# Altium footprint library Test_Stand_Pergam.PcbLib: 30 footprints (part 1 of 2)
Each footprint in its own frame and in the unit in brackets; x right, y up, seen from the top. Pads: shape width x height; smd on the part's side, far side on the other; paste and mask are expansions set on the pad; w line width, h text height; cw(c..) or ccw(c..) is an arc to the next point about the centre after c.
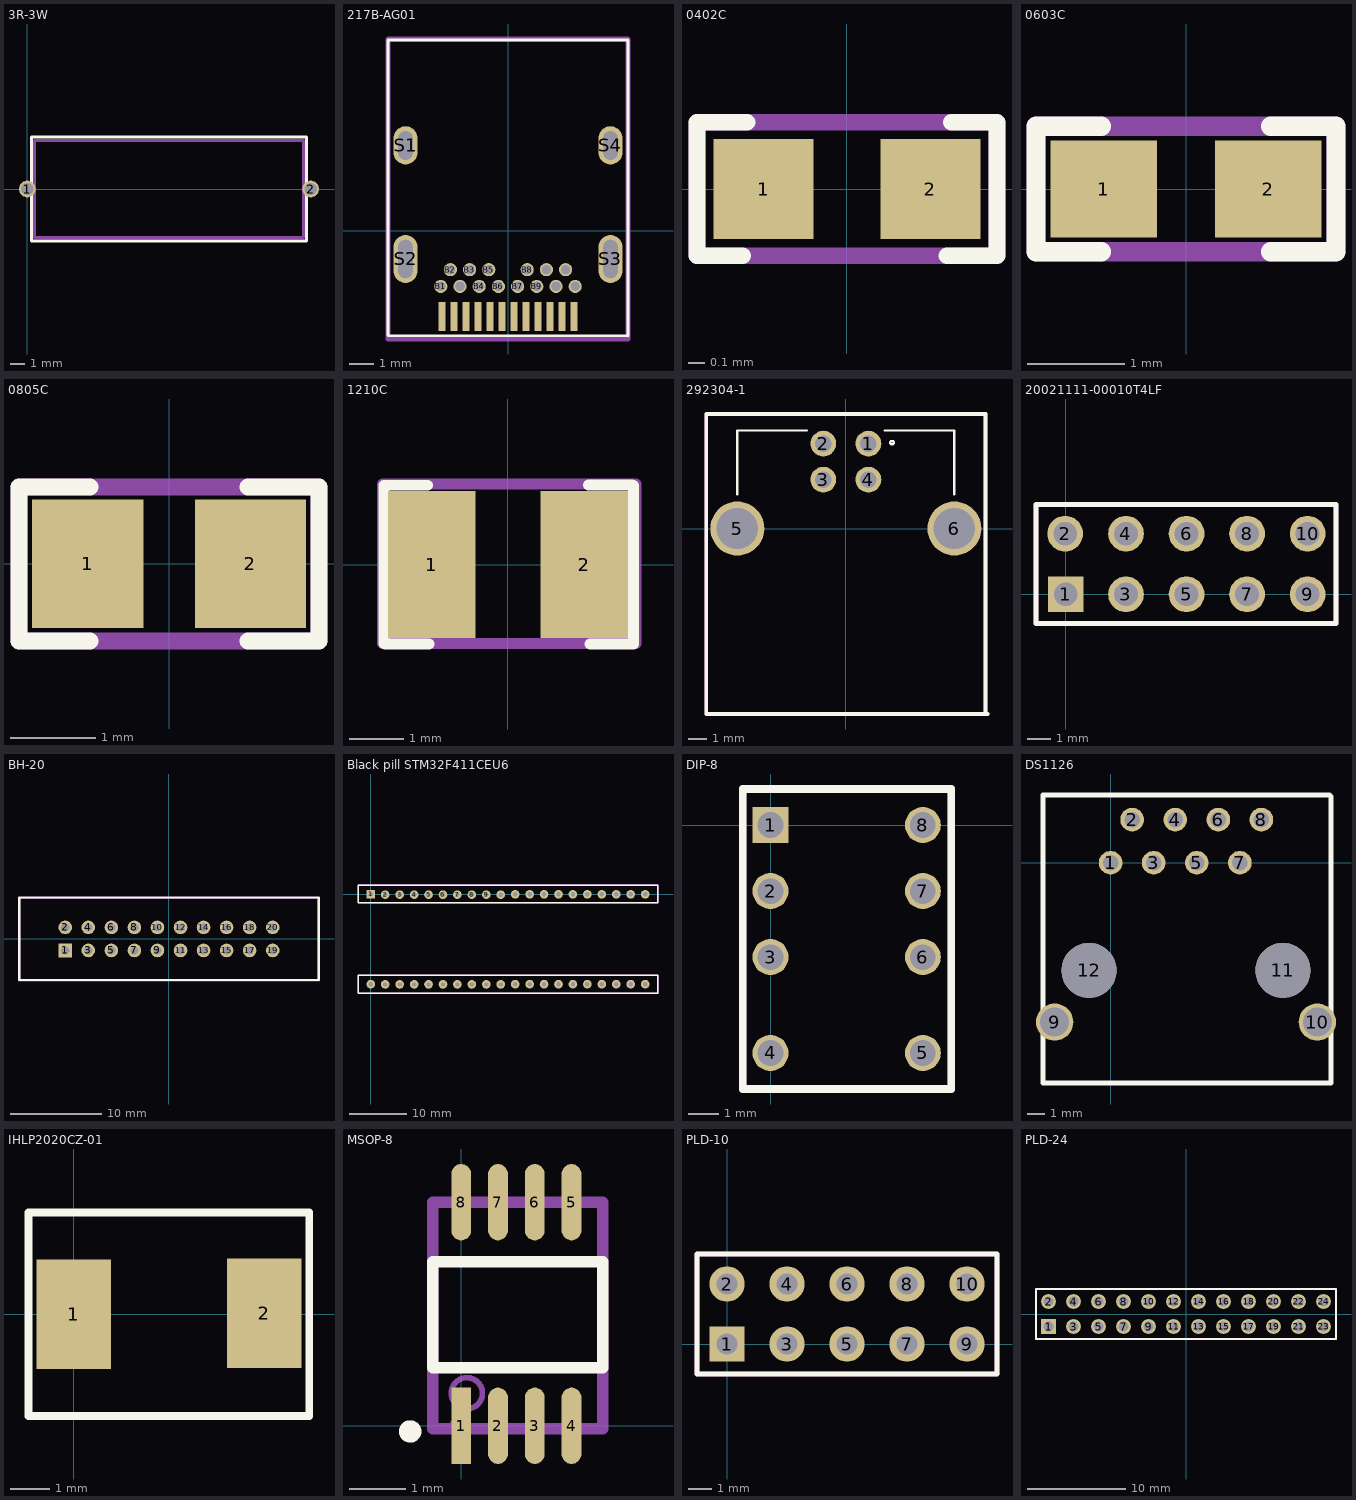
[diagram p0: the footprints below, top view; thin cyan lines are the x and y axes]

## 3R-3W [mm]
pads (2):
  round 1.15 hole 0.85: 1(0,0) 2(19.5,0)
Top Overlay:
  lines w0.2: 0.275,-3.575 0.275,3.575 19.225,3.575 19.225,-3.575 0.275,-3.575
Mechanical 1:
  lines w0.2: 0.5,3.35 0.5,-3.35 19,-3.35 19,0.5 19,3.35 0.525,3.35
Mechanical 29:
  lines w0.2: 0.5,3.35 0.5,-3.35 19,-3.35 19,0.5 19,3.35 0.525,3.35
  text "'.Designator'" at 1.175,0.433 h1

## 217B-AG01 [mm]
pads (30):
  rect 0.3x1.2 smd: A1(2.75,-3.565) A2(2.25,-3.565) A3(1.75,-3.565) A4(1.25,-3.565) A5(0.75,-3.565) A6(0.25,-3.565) A7(-0.25,-3.565) A8(-0.75,-3.565) A9(-1.25,-3.565) A10(-1.75,-3.565) A11(-2.25,-3.565) A12(-2.75,-3.565)
  round 0.55 hole 0.4: B1(-2.8,-2.31) B2(-2.4,-1.61) B3(-1.6,-1.61) B4(-1.2,-2.31) B5(-0.8,-1.61) B6(-0.4,-2.31) B7(0.4,-2.31) B8(0.8,-1.61) B9(1.2,-2.31) B10(1.6,-1.61) B11(2.4,-1.61) B12(2.8,-2.31) MID(-2,-2.31) MID1(2,-2.31)
  oval 1x1.6 hole 0.6 slot 1.2 at 90 deg: S1(-4.27,3.565) S4(4.27,3.565)
  oval 1x2 hole 0.6 slot 1.6 at 90 deg: S2(-4.27,-1.165) S3(4.27,-1.165)
Top Overlay:
  lines w0.127: -5,-4.363 5,-4.367 5,7.965 -5,7.967 -5,-4.363
Mechanical 29:
  lines w0.2: -5,-4.5 5,-4.5 5,8 -5,8 -5,-4.5
  text "'.Designator'" at -1.25,0.78 h0.39
3D body "217B-AG01.STEP": height 3.08, standoff -1.38, extent -4.37,-3.84 4.37,7.989

## 0402C [mm]
height 0.6
pads (2):
  rect 0.6x0.6 smd: 1(-0.5,0) 2(0.5,0)
Top Overlay:
  lines w0.1: -0.625,-0.4 -0.9,-0.4 -0.9,0.4 -0.6,0.4 ; 0.6,-0.4 0.9,-0.4 0.9,0.4 0.625,0.4
Mechanical 29:
  lines w0.1: -0.9,-0.4 0.9,-0.4 0.9,0.4 -0.9,0.4 -0.9,-0.4
  text "'.Designator'" at -0.7,-0.2 h0.39
3D body "User Library-User Library-0402_Cap.STEP": height 0.51, standoff 0, extent -0.73,-0.25 0.73,0.25

## 0603C [mm]
height 0.9
pads (2):
  rect 1.1x1 smd: 1(-0.85,0) 2(0.85,0)
Top Overlay:
  lines w0.2: -0.875,-0.65 -1.55,-0.65 -1.55,0.65 -0.875,0.65 ; 0.875,-0.65 1.55,-0.65 1.55,0.65 0.875,0.65
Mechanical 29:
  lines w0.2: -1.55,-0.65 -1.55,0.65 1.55,0.65 1.55,-0.65 -1.55,-0.65
  text "'.Designator'" at -1.2,-0.3 h0.6
3D body "0603_Cap.STEP": height 0.8, standoff 0, extent -1.23,-0.425 1.23,0.375

## 0805C [mm]
height 1.3
pads (2):
  rect 1.3x1.5 smd: 1(-0.95,0) 2(0.95,0)
Top Overlay:
  lines w0.2: -0.927,0.898 -1.752,0.898 -1.751,-0.902 -0.926,-0.902 ; 0.923,0.898 1.748,0.898 1.75,-0.902 0.924,-0.902
Mechanical 29:
  lines w0.2: -1.752,-0.902 1.748,-0.902 1.748,0.898 -1.752,0.898 -1.752,-0.902
  text "'.Designator'" at -1.852,-0.502 h1
3D body "CAP_0805.step": height 0.8, standoff 0, extent -1.351,-0.626 1.449,0.624

## 1210C [mm]
height 1.7
pads (2):
  rect 1.6x2.7 smd: 1(-1.4,0) 2(1.4,0)
Top Overlay:
  lines w0.2: -2.275,-1.45 -2.275,1.453 -1.478,1.453 ; -2.25,-1.455 -1.45,-1.455 ; 1.475,1.455 2.275,1.455 ; 1.503,-1.453 2.3,-1.453 2.3,1.45
Mechanical 29:
  lines w0.2: -2.3,-1.45 2.35,-1.45 2.35,1.475 -2.3,1.475 -2.3,-1.45
  text "'.Designator'" at -1.8,-0.5 h1
3D body "1210_Cap.step": height 1.61, standoff 0, extent -2.445,-1.225 2.495,1.275

## 292304-1 [mm]
height 0.65
pads (6):
  round 1.428 hole 0.92: 1(1.25,4.71) 2(-1.25,4.71) 3(-1.25,2.71) 4(1.25,2.71)
  round 3 hole 2.3: 5(-6.02,0) 6(6.02,0)
Top Overlay:
  circle w0.127: c2.56,4.76 r0.098
  lines w0.127: -6.015,1.905 -6.015,5.43 -2.16,5.43 ; 2.16,5.43 6.015,5.43 6.015,1.905
  lines w0.2: -7.747,-10.287 7.874,-10.287 7.747,-10.287 7.747,6.35 -7.747,6.35 -7.747,-10.287
Mechanical 29:
  lines w0.2: -7.747,-10.287 -7.747,6.35 7.747,6.35 7.747,-10.287 7.874,-10.287 -7.747,-10.287
  text "'.Designator'" at -1.4,-0.385 h0.39
3D body "usb_a-usbsb.stp": height 11.28, standoff -2.72, extent -7.275,-10.25 7.324,6.25

## 20021111-00010T4LF [mm]
pads (10):
  rect 1.5x1.5 hole 1: 1(0,0)
  round 1.5 hole 1: 2(-0.025,2.54) 3(2.525,0) 4(2.525,2.54) 5(5.065,0) 6(5.065,2.54) 7(7.605,0) 8(7.605,2.54) 9(10.145,0) 10(10.145,2.54)
Top Overlay:
  lines w0.2: -1.25,-1.23 11.335,-1.23 11.335,3.77 -1.25,3.77 -1.25,-1.23
Mechanical 29:
  lines w0.2: -1.25,-1.23 11.335,-1.23 11.335,0.02 11.335,2.52 11.335,3.77 -1.25,3.77 -1.25,-1.23
  text "'.Designator" at -0.507,0.959 h0.7

## BH-20 [mm]
height 8.5
pads (20):
  rect 1.5x1.5 hole 0.9: 1(-11.43,-1.27)
  round 1.5 hole 0.9: 2(-11.43,1.27) 3(-8.89,-1.27) 4(-8.89,1.27) 5(-6.35,-1.27) 6(-6.35,1.27) 7(-3.81,-1.27) 8(-3.81,1.27) 9(-1.27,-1.27) 10(-1.27,1.27) 11(1.27,-1.27) 12(1.27,1.27) 13(3.81,-1.27) 14(3.81,1.27) 15(6.35,-1.27) 16(6.35,1.27) 17(8.89,-1.27) 18(8.89,1.27) 19(11.43,-1.27) 20(11.43,1.27)
Top Overlay:
  lines w0.2: -16.525,4.56 -16.525,-4.54 16.48,-4.54 16.48,4.56 ; -16.525,4.575 16.48,4.575 ; -16.475,4.56 -16.475,-4.54 16.53,-4.54 16.53,4.56 ; -16.475,4.575 16.53,4.575 ; -16.5,-4.54 -16.5,4.56 -16.5,-4.54 ; -16.5,-4.54 16.505,-4.54 ; -16.5,-4.54 16.505,-4.54 ; 16.505,-4.54 16.505,4.56 16.505,-4.54 ; -16.5,4.575 16.505,4.575 -16.5,4.575
Mechanical 29:
  lines w0.2: -16.525,4.51 -16.525,-4.59 16.48,-4.59 16.48,4.51 ; -16.525,4.525 16.48,4.525 ; -16.475,4.51 -16.475,-4.59 16.53,-4.59 16.53,4.51 ; -16.475,4.525 16.53,4.525 ; -16.5,-4.59 -16.5,4.51 -16.5,-4.59 ; -16.5,-4.59 16.505,-4.59 ; -16.5,-4.59 16.505,-4.59 ; 16.505,-4.59 16.505,4.51 16.505,-4.59 ; -16.5,4.525 16.505,4.525 -16.5,4.525
  text "'.Designator'" at -11.196,-0.413 h1.52
3D body "User Library-BH-20.STEP": height 8.75, standoff -3.1, extent -16.495,-4.55 16.525,4.55

## Black pill STM32F411CEU6 [mil]
pads (40):
  rect 60x60 hole 30: 1(0,0)
  round 60 hole 30: 2(100,-1.57) 3(200,-1.57) 4(300,-1.57) 5(400,-1.57) 6(500,-1.57) 7(600,-1.57) 8(700,-1.57) 9(800,-1.57) 10(900,-1.57) 11(1000,0) 12(1100,0) 13(1200,0) 14(1300,0) 15(1400,0) 16(1500,0) 17(1600,0) 18(1700,0) 19(1800,0) 20(1900,0) 21(0,-622.05) 22(100,-623.62) 23(200,-623.62) 24(300,-623.62) 25(400,-623.62) 26(500,-623.62) 27(600,-623.62) 28(700,-623.62) 29(800,-623.62) 30(900,-623.62) 31(1000,-622.05) 32(1100,-622.05) 33(1200,-622.05) 34(1300,-622.05) 35(1400,-622.05) 36(1500,-622.05) 37(1600,-622.05) 38(1700,-622.05) 39(1800,-622.05) 40(1900,-622.05)
Top Overlay:
  lines w10: -88.58,-683.07 -88.58,-561.02 1988.58,-561.02 1988.58,-683.07 -88.58,-683.07 ; -88.58,-57.48 -88.58,64.57 1988.58,64.57 1988.58,-57.48 -88.58,-57.48
Mechanical 29:
  lines w10: -88.58,-682.09 -88.58,-560.04 1989.17,-560.04 1989.17,-682.09 1988.19,-683.07 -87.6,-683.07 ; -88.58,-57.09 -88.58,64.96 1989.17,64.96 1989.17,-57.09 1988.19,-58.07 -87.6,-58.07

## DIP-8 [mm]
pads (8):
  rect 1.2x1.2 hole 0.85: 1(0,0)
  round 1.2 hole 0.85: 2(0,-2.2) 3(0,-4.4) 4(0,-7.6) 5(5.08,-7.6) 6(5.08,-4.4) 7(5.08,-2.2) 8(5.08,0)
Top Overlay:
  lines w0.254: -0.925,-8.8 -0.925,1.2 6.025,1.2 6.025,-8.8 -0.925,-8.8
Mechanical 29:
  lines w0.254: -0.925,-8.8 -0.925,1.2 6.025,1.2 6.025,-8.8 -0.925,-8.8
  text "'.Designator'" at 0.025,0.225 h0.75
3D body "User Library-IM03TS.STEP": height 5.66, standoff -3.2, extent -0.475,-8.825 5.525,1.175

## DS1126 [mm] "RJ-45 Sheilded Connector"
height 16.25
pads (12):
  round 1.4 hole 0.9: 1(0,0) 2(1.27,2.54) 3(2.54,0) 4(3.81,2.54) 5(5.08,0) 6(6.35,2.54) 7(7.62,0) 8(8.89,2.54)
  round 2.2 hole 1.7: 9(-3.305,-9.4) 10(12.195,-9.4)
  round 3.25 hole 3.25 unplated: 11(10.16,-6.35) 12(-1.27,-6.35)
Top Overlay:
  lines w0.3: -4,-13 -4,4 5,4 12.9,4 13,3.9 13,-13 -4,-13
Mechanical 29:
  lines w0.2: -4,-13 -4,4 13,4 13,-13 -4,-13
  text "'.Designator'" at 2.8,-4.2 h1

## IHLP2020CZ-01 [mm]
pads (2):
  rect 1.905x2.79 smd: 1(0,0) 2(4.851,0.025)
Top Overlay:
  lines w0.2: -1.157,-2.59 5.996,-2.59 5.996,2.59 -1.157,2.59 -1.157,-2.59
Mechanical 29:
  lines w0.1: -1.15,-2.575 -1.15,2.6 6,2.6 6,-2.575 -1.15,-2.575
  text "'.Designator'" at -0.2,-0.3 h1
3D body "IHLP SMD 2020.stp": height 1.95, standoff 0.03, extent -0.252,-2.568 5.199,2.578

## MSOP-8 [mm] "8-Lead Mini Small Outline Package [MSOP]"
height 1.1
pads (8):
  rect 0.35x1.35 smd: 1(0,0)
  oval 0.35x1.35 smd: 2(0.65,0) 3(1.3,0) 4(1.95,0) 5(1.95,3.95) 6(1.3,3.95) 7(0.65,3.95) 8(0,3.95)
Top Overlay:
  circle w0.254: c-0.9,-0.1 r0.071
  lines w0.2: -0.5,1.025 2.5,1.025 2.5,2.9 -0.5,2.9 -0.5,1.025
Mechanical 29:
  circle w0.254: c-0.025,0 r0.05
  circle w0.1: c0.1,0.575 r0.275
  lines w0.2: -0.5,-0.05 2.5,-0.05 2.5,3.95 -0.5,3.95 -0.5,-0.05
  text "'.Designator'" at -0.1,1.7 h0.5
3D body "MSOP-8-1EP_3x3mm_P0.65mm_EP1.68x1.88mm.step": height 0.95, standoff 0, extent -0.5,-0.45 2.5,4.45

## PLD-10 [mm]
height 8.5
pads (10):
  rect 1.5x1.5 hole 0.9: 1(0,0)
  round 1.5 hole 0.9: 2(0,2.54) 3(2.54,0) 4(2.54,2.54) 5(5.08,0) 6(5.08,2.54) 7(7.62,0) 8(7.62,2.54) 9(10.16,0) 10(10.16,2.54)
Top Overlay:
  lines w0.2: -1.27,-1.27 -1.27,3.81 11.43,3.81 11.43,-1.27 -1.27,-1.27
Mechanical 29:
  circle w0.254: c0,0 r0.141
  lines w0.2: -1.27,-1.27 -1.27,3.81 11.43,3.81 11.43,-1.27 -1.27,-1.27
  text "'.Designator'" at 2,1 h1
3D body "User Library-PLD10.STEP": height 8.54, standoff -3, extent -1.27,-1.265 11.43,3.815

## PLD-24 [mm]
height 8.5
pads (24):
  rect 1.5x1.5 hole 1: 1(-13.97,-1.27)
  round 1.5 hole 1: 2(-13.97,1.27) 3(-11.43,-1.27) 4(-11.43,1.27) 5(-8.89,-1.27) 6(-8.89,1.27) 7(-6.35,-1.27) 8(-6.35,1.27) 9(-3.81,-1.27) 10(-3.81,1.27) 11(-1.27,-1.27) 12(-1.27,1.27) 13(1.27,-1.27) 14(1.27,1.27) 15(3.81,-1.27) 16(3.81,1.27) 17(6.35,-1.27) 18(6.35,1.27) 19(8.89,-1.27) 20(8.89,1.27) 21(11.43,-1.27) 22(11.43,1.27) 23(13.97,-1.27) 24(13.97,1.27)
Top Overlay:
  lines w0.2: -15.24,-2.54 15.24,-2.54 15.24,2.54 -15.24,2.54 -15.24,-2.54
Mechanical 29:
  circle w0.254: c-14.111,-1.27 r0.141
  lines w0.2: -15.24,-2.54 15.24,-2.54 15.24,2.54 -15.24,2.54 -15.24,-2.54
  text "'.Designator'" at -0.25,0 h0.39
3D body "User Library-DS1021-1x6S61.step": height 8.6, standoff -3, extent -15.24,0 0,2.54
3D body "User Library-DS1021-1x6S61.step": height 8.6, standoff -3, extent 0,0 15.24,2.54
3D body "User Library-DS1021-1x6S61.step": height 8.6, standoff -3, extent 0,-2.54 15.24,0
3D body "User Library-DS1021-1x6S61.step": height 8.6, standoff -3, extent -15.24,-2.54 0,0